# Altium footprint library Connectors.PcbLib: 164 footprints (part 10 of 11)
Each footprint in its own frame and in the unit in brackets; x right, y up, seen from the top. Pads: shape width x height; smd on the part's side, far side on the other; paste and mask are expansions set on the pad; w line width, h text height; cw(c..) or ccw(c..) is an arc to the next point about the centre after c.
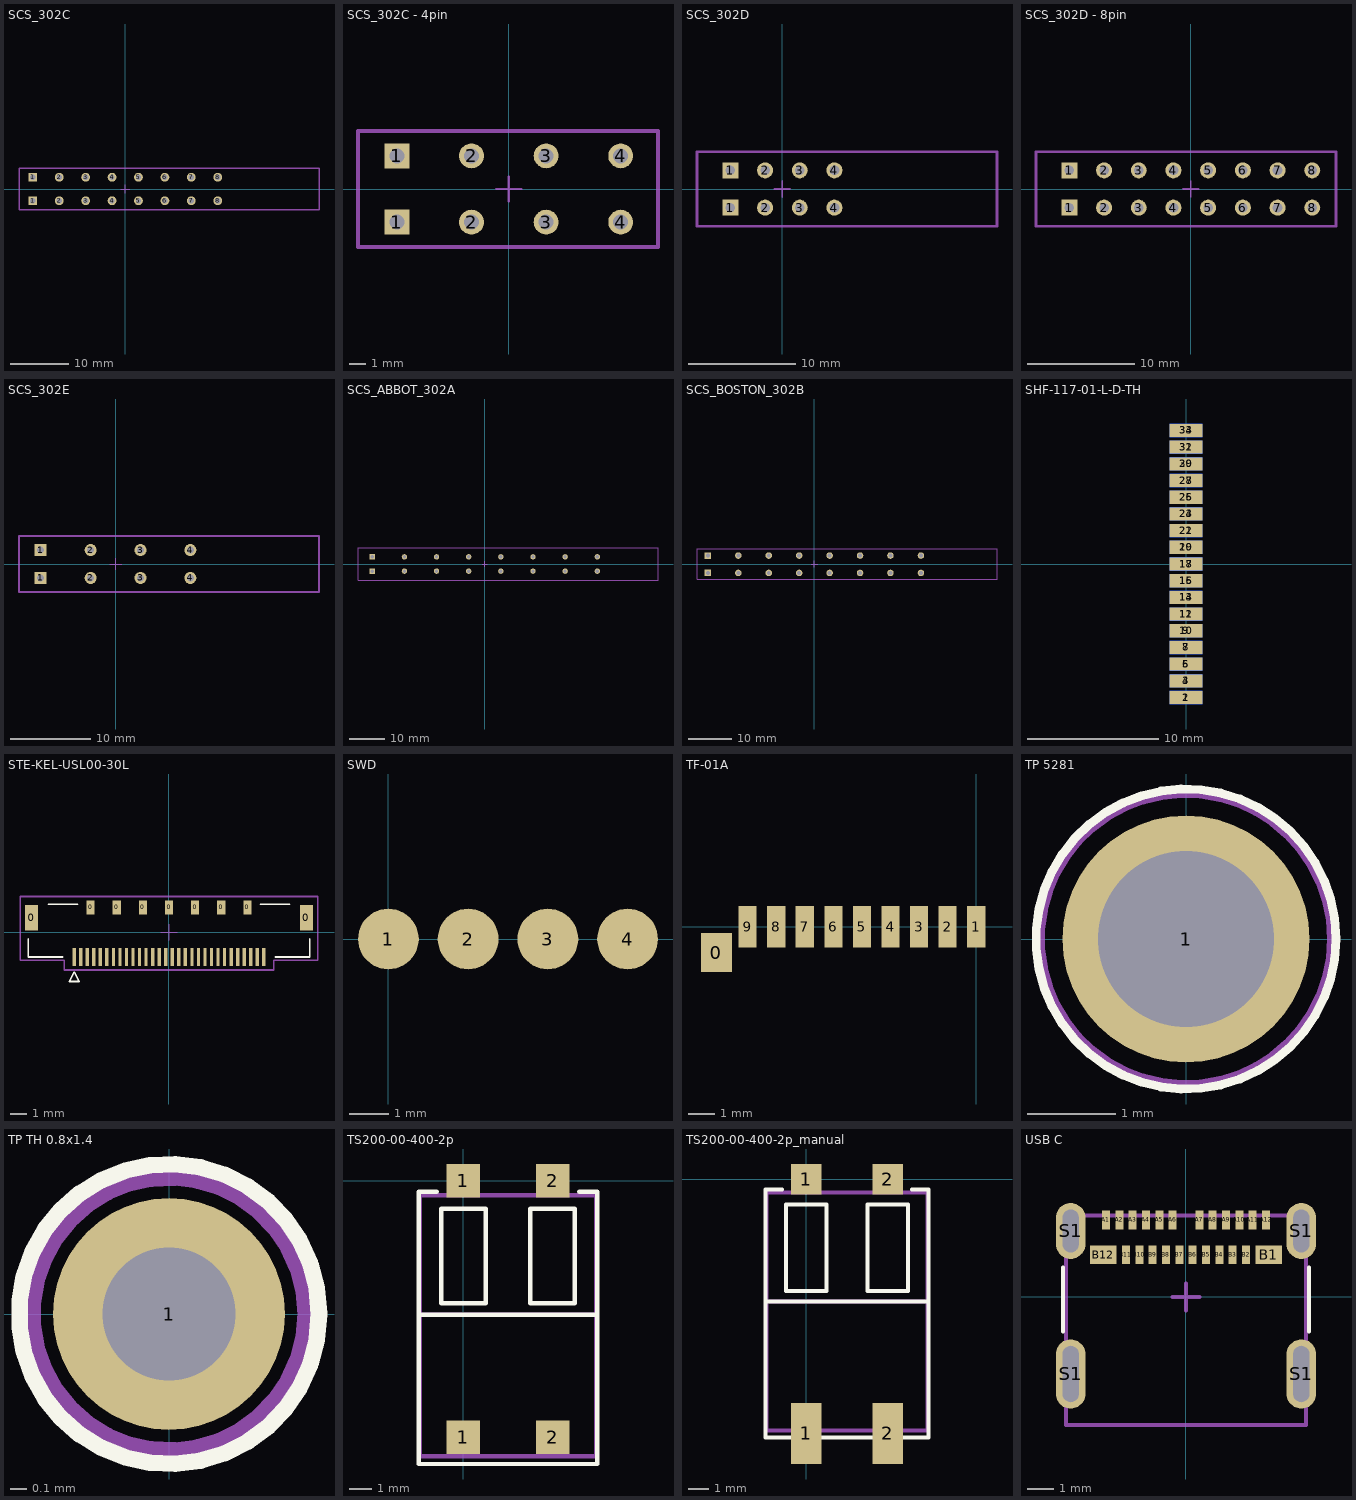
[diagram p9: the footprints below, top view; thin cyan lines are the x and y axes]

## SCS_302C [mm] "Rishena 302C 8 pin connector implanted  electrode"
height 5
pads (16):
  rect 1.5x1.5 hole 0.9: 1(-15.75,-2) 1(-15.75,2)
  round 1.5 hole 0.9: 2(-11.25,-2) 2(-11.25,2) 3(-6.75,-2) 3(-6.75,2) 4(-2.25,-2) 4(-2.25,2) 5(2.25,-2) 5(2.25,2) 6(6.75,-2) 6(6.75,2) 7(11.25,-2) 7(11.25,2) 8(15.75,-2) 8(15.75,2)
Mechanical 15:
  lines w0.15: -0.75,0 0.75,0 ; 0,-0.75 0,0.75
  lines w0.254: -18.1,-3.5 33,-3.5 33,3.5 -18.1,3.5 -18.1,-3.5
3D body "Header.step": height 5.1, standoff 0, extent -15.9,-1.95 -15.6,1.95
3D body "Header.step": height 5.1, standoff 0, extent 15.6,-1.95 15.9,1.95
3D body "Header.step": height 5.1, standoff 0, extent -11.4,-1.95 -11.1,1.95
3D body "Header.step": height 5.1, standoff 0, extent -6.9,-1.95 -6.6,1.95
3D body "Header.step": height 5.1, standoff 0, extent -2.4,-1.95 -2.1,1.95
3D body "Header.step": height 5.1, standoff 0, extent 2.1,-1.95 2.4,1.95
3D body "Header.step": height 5.1, standoff 0, extent 6.6,-1.95 6.9,1.95
3D body "Header.step": height 5.1, standoff 0, extent 11.1,-1.95 11.4,1.95
3D body "302C.step": height 0.65, standoff -0.65, extent -17.3,-3.107 32.224,3.135

## SCS_302C - 4pin [mm] "Rishena 302C 4 pin connector implanted  electrode"
height 5
pads (8):
  rect 1.5x1.5 hole 0.9: 1(-6.75,-2) 1(-6.75,2)
  round 1.5 hole 0.9: 2(-2.25,-2) 2(-2.25,2) 3(2.25,-2) 3(2.25,2) 4(6.75,-2) 4(6.75,2)
Mechanical 15:
  lines w0.15: -0.75,0 0.75,0 ; 0,-0.75 0,0.75
  lines w0.254: -9.1,-3.5 -9.1,3.5 9,3.5 9,-3.5 -9.1,-3.5
3D body "Header.step": height 5.1, standoff 0, extent 6.6,-1.95 6.9,1.95
3D body "Header.step": height 5.1, standoff 0, extent 2.1,-1.95 2.4,1.95
3D body "Header.step": height 5.1, standoff 0, extent -2.4,-1.95 -2.1,1.95
3D body "Header.step": height 5.1, standoff 0, extent -6.9,-1.95 -6.6,1.95
3D body "302C.step": height 3.85, standoff 2.55, extent -9,-3.107 40.524,3.135

## SCS_302D [mm] "Rishena 302D 4pin connector implanted  electrode"
height 5
pads (8):
  rect 1.5x1.5 hole 0.9: 1(-4.875,-1.75) 1(-4.875,1.75)
  round 1.5 hole 0.9: 2(-1.625,-1.75) 2(-1.625,1.75) 3(1.625,-1.75) 3(1.625,1.75) 4(4.875,-1.75) 4(4.875,1.75)
Mechanical 15:
  lines w0.15: -0.75,0 0.75,0 ; 0,-0.75 0,0.75
  lines w0.254: -8,-3.5 -8,3.5 20.1,3.5 20.1,-3.5 -8,-3.5
3D body "302D.step": height 2.8, standoff 1.8, extent -5.5,-1.591 20.821,3.743
3D body "Header.step": height 4.1, standoff -1, extent 4.7,-1.9 5,2
3D body "Header.step": height 4.1, standoff -1, extent -5.025,-1.9 -4.725,2
3D body "Header.step": height 4.1, standoff -1, extent -1.783,-1.9 -1.483,2
3D body "Header.step": height 4.1, standoff -1, extent 1.458,-1.9 1.758,2

## SCS_302D - 8pin [mm] "Rishena 302D 8pin connector implanted  electrode"
height 5
pads (16):
  rect 1.5x1.5 hole 0.9: 1(-11.375,-1.75) 1(-11.375,1.75)
  round 1.5 hole 0.9: 2(-8.125,-1.75) 2(-8.125,1.75) 3(-4.875,-1.75) 3(-4.875,1.75) 4(-1.625,-1.75) 4(-1.625,1.75) 5(1.625,-1.75) 5(1.625,1.75) 6(4.875,-1.75) 6(4.875,1.75) 7(8.125,-1.75) 7(8.125,1.75) 8(11.375,-1.75) 8(11.375,1.75)
Mechanical 15:
  lines w0.15: -0.75,0 0.75,0 ; 0,-0.75 0,0.75
  lines w0.254: -14.5,-3.5 13.6,-3.5 13.6,3.5 -14.5,3.5 -14.5,-3.5
3D body "Header.step": height 4.1, standoff -1, extent 7.958,-1.9 8.258,2
3D body "Header.step": height 4.1, standoff -1, extent 11.2,-1.9 11.5,2
3D body "Header.step": height 4.1, standoff -1, extent 1.458,-1.9 1.758,2
3D body "Header.step": height 4.1, standoff -1, extent 4.7,-1.9 5,2
3D body "Header.step": height 4.1, standoff -1, extent -5.042,-1.9 -4.742,2
3D body "Header.step": height 4.1, standoff -1, extent -8.283,-1.9 -7.983,2
3D body "Header.step": height 4.1, standoff -1, extent -11.525,-1.9 -11.225,2
3D body "Header.step": height 4.1, standoff -1, extent -1.8,-1.9 -1.5,2

## SCS_302E [mm] "Rishena 302E 4pin connector implanted  electrode"
height 5
pads (8):
  rect 1.5x1.5 hole 0.9: 1(-9.387,-1.75) 1(-9.387,1.75)
  round 1.5 hole 0.9: 2(-3.129,-1.75) 2(-3.129,1.75) 3(3.129,-1.75) 3(3.129,1.75) 4(9.387,-1.75) 4(9.387,1.75)
Mechanical 15:
  lines w0.15: -0.75,0 0.75,0 ; 0,-0.75 0,0.75
  lines w0.254: -12.1,-3.5 25.5,-3.5 25.5,3.5 -12.1,3.5 -12.1,-3.5
3D body "302E.step": height 0.5, standoff -0.5, extent -10.1,-1.759 25.221,5.196
3D body "Header.step": height 4.1, standoff -1, extent 3.012,-1.85 3.312,2.05
3D body "Header.step": height 4.1, standoff -1, extent -3.263,-1.85 -2.963,2.05
3D body "Header.step": height 4.1, standoff -1, extent -9.537,-1.85 -9.237,2.05
3D body "Header.step": height 4.1, standoff -1, extent 9.287,-1.85 9.587,2.05

## SCS_ABBOT_302A [mm] "Abbot and Rishena 302A 8 pin connector implanted  electrode"
height 5
pads (16):
  rect 1.5x1.5 hole 0.9: 1(-31.5,-2) 1(-31.5,2)
  round 1.5 hole 0.9: 2(-22.5,-2) 2(-22.5,2) 3(-13.5,-2) 3(-13.5,2) 4(-4.5,-2) 4(-4.5,2) 5(4.5,-2) 5(4.5,2) 6(13.5,-2) 6(13.5,2) 7(22.5,-2) 7(22.5,2) 8(31.5,-2) 8(31.5,2)
Mechanical 15:
  lines w0.15: -0.75,0 0.75,0 ; 0,-0.75 0,0.75
  lines w0.254: -35.5,-4.5 48.5,-4.5 48.5,4.5 -35.5,4.5 -35.5,-4.5
3D body "Header.step": height 4.1, standoff -1, extent -31.65,-1.95 -31.35,1.95
3D body "Header.step": height 4.1, standoff -1, extent 31.35,-1.95 31.65,1.95
3D body "Header.step": height 4.1, standoff -1, extent -22.65,-1.95 -22.35,1.95
3D body "Header.step": height 4.1, standoff -1, extent -13.65,-1.95 -13.35,1.95
3D body "Header.step": height 4.1, standoff -1, extent -4.65,-1.95 -4.35,1.95
3D body "Header.step": height 4.1, standoff -1, extent 4.35,-1.95 4.65,1.95
3D body "Header.step": height 4.1, standoff -1, extent 13.35,-1.95 13.65,1.95
3D body "Header.step": height 4.1, standoff -1, extent 22.35,-1.95 22.65,1.95
3D body "ABBOT-302A.step": height 2.95, standoff 1.65, extent -33,-3.349 48.024,3.125

## SCS_BOSTON_302B [mm] "Boston and Rishena 302B 8 pin connector implanted  electrode"
height 5
pads (16):
  rect 1.5x1.5 hole 0.9: 1(-24.5,-2) 1(-24.5,2)
  round 1.5 hole 0.9: 2(-17.5,-2) 2(-17.5,2) 3(-10.5,-2) 3(-10.5,2) 4(-3.5,-2) 4(-3.5,2) 5(3.5,-2) 5(3.5,2) 6(10.5,-2) 6(10.5,2) 7(17.5,-2) 7(17.5,2) 8(24.5,-2) 8(24.5,2)
Mechanical 15:
  lines w0.15: -0.75,0 0.75,0 ; 0,-0.75 0,0.75
  lines w0.254: -27,-3.4 -27,3.5 42,3.5 42,-3.4 -27,-3.4
3D body "Header.step": height 4.1, standoff -1, extent -24.65,-1.95 -24.35,1.95
3D body "Header.step": height 4.1, standoff -1, extent 24.35,-1.95 24.65,1.95
3D body "Header.step": height 4.1, standoff -1, extent -17.65,-1.95 -17.35,1.95
3D body "Header.step": height 4.1, standoff -1, extent -10.65,-1.95 -10.35,1.95
3D body "Header.step": height 4.1, standoff -1, extent -3.65,-1.95 -3.35,1.95
3D body "Header.step": height 4.1, standoff -1, extent 3.35,-1.95 3.65,1.95
3D body "Header.step": height 4.1, standoff -1, extent 10.35,-1.95 10.65,1.95
3D body "Header.step": height 4.1, standoff -1, extent 17.35,-1.95 17.65,1.95
3D body "BOSTON-302B.step": height 2.95, standoff 1.65, extent -26,-2.597 41.024,2.287

## SHF-117-01-L-D-TH [mm] "CONN HEADER VERT 34POS 1.27MM"
pads (34):
  rect 2.5x1 smd: 1(0,-10.16) 3(0,-8.89) 5(0,-7.62) 7(0,-6.35) 9(0,-5.08) 11(0,-3.81) 13(0,-2.54) 15(0,-1.27) 17(0,0) 19(0,1.27) 21(0,2.54) 23(0,3.81) 25(0,5.08) 27(0,6.35) 29(0,7.62) 31(0,8.89) 33(0,10.16)
  rect 2.5x1 smd far side: 2(0,-10.16) 4(0,-8.89) 6(0,-7.62) 8(0,-6.35) 10(0,-5.08) 12(0,-3.81) 14(0,-2.54) 16(0,-1.27) 18(0,0) 20(0,1.27) 22(0,2.54) 24(0,3.81) 26(0,5.08) 28(0,6.35) 30(0,7.62) 32(0,8.89) 34(0,10.16)
3D body "SHF-117-01-L-D-TH.stp": height 2.1, standoff -3.49, extent -4.699,-13.97 2.54,13.97

## STE-KEL-USL00-30L [mm]
height 1
pads (39):
  rect 0.8x1.55 smd: 0(-8.4,0.885) 0(8.4,0.885)
  rect 0.5x0.88 smd: 0(-4.8,1.515) 0(-3.2,1.515) 0(-1.6,1.515) 0(0,1.515) 0(1.6,1.515) 0(3.2,1.515) 0(4.8,1.515)
  rect 0.2x1.1 smd: 1(-5.8,-1.515) 2(-5.4,-1.515) 3(-5,-1.515) 4(-4.6,-1.515) 5(-4.2,-1.515) 6(-3.8,-1.515) 7(-3.4,-1.515) 8(-3,-1.515) 9(-2.6,-1.515) 10(-2.2,-1.515) 11(-1.8,-1.515) 12(-1.4,-1.515) 13(-1,-1.515) 14(-0.6,-1.515) 15(-0.2,-1.515) 16(0.2,-1.515) 17(0.6,-1.515) 18(1,-1.515) 19(1.4,-1.515) 20(1.8,-1.515) 21(2.2,-1.515) 22(2.6,-1.515) 23(3,-1.515) 24(3.4,-1.515) 25(3.8,-1.515) 26(4.2,-1.515) 27(4.6,-1.515) 28(5,-1.515) 29(5.4,-1.515) 30(5.8,-1.515)
Top Overlay:
  lines w0.1: -8.6,-0.415 -8.6,-1.515 -6.5,-1.515 ; -7.375,1.71 -5.6,1.71 ; 5.6,1.71 7.375,1.71 ; 6.5,-1.515 8.6,-1.515 8.6,-0.415 ; -6.1,-3.015 -5.8,-2.44 -5.5,-3.015 -6.1,-3.015
Mechanical 13:
  lines w0.05: -0.5,0 0,0 ; 0,-0.5 0,0 ; 0,0.5 0,0 ; 0.5,0 0,0
  lines w0.1: -9.1,-1.715 -9.1,2.185 9.1,2.185 9.1,-1.715 6.4,-1.715 6.4,-2.315 -6.4,-2.315 -6.4,-1.715 -9.1,-1.715
3D body "User Library-usl00-30l_p0-4_l16-6_w2-75-1.step": height 0.97, standoff -0.03, extent -8.3,-1.515 8.3,1.585

## SWD [mil]
pads (4):
  round 60 smd paste-60 mask+2.01: 1(0,0) 2(78.74,0) 3(157.48,0) 4(236.22,0)

## TF-01A [mm] "SD Card Connector"
height 2.45
pads (10):
  rect 1.2x1.5 smd: 0(-10,-1)
  rect 0.7x1.6 smd: 1(0,0) 2(-1.1,0) 3(-2.2,0) 4(-3.3,0) 5(-4.4,0) 6(-5.5,0) 7(-6.6,0) 8(-7.7,0) 9(-8.8,0)

## TP 5281 [mm]
pads (1):
  round 2.8 hole 2 unplated mask+0.07: 1(0,0)
Top Overlay:
  circle w0.1: c0,0 r1.7
Mechanical 15:
  circle w0.1: c0,0 r1.649
  lines w0.15: -0.5,0 0.5,0 ; 0,-0.5 0,0.5
3D body "5281.step": height 8.12, standoff -3.17, extent -1.576,-1.587 1.576,1.587

## TP TH 0.8x1.4 [mm]
pads (1):
  round 1.4 hole 0.8 mask+0.07: 1(0,0)
Top Overlay:
  circle w0.1: c0,0 r0.906
Mechanical 15:
  circle w0.1: c0,0 r0.825
  lines w0.15: -0.5,0 0.5,0 ; 0,-0.5 0,0.5

## TS200-00-400-2p [mm] "SMD PCB terminal block"
height 4.5
pads (4):
  rect 1.5x1.5 smd: 1(0,-11.5) 1(0,0) 2(4,-11.5) 2(4,0)
Top Overlay:
  lines w0.2: -2,-6 6,-6 ; -1.2,-0.5 -2,-0.5 -2,-12.7 6,-12.7 6,-0.5 5.2,-0.5 ; -1,-5.5 1,-5.5 1,-1.25 -1,-1.25 -1,-5.5 ; 3,-5.5 5,-5.5 5,-1.25 3,-1.25 3,-5.5
Mechanical 13:
  lines w0.2: -1.95,-6 5.95,-6 ; -1.95,-12.35 -1.95,-0.65 5.95,-0.65 5.95,-12.35 -1.95,-12.35
3D body "2060-452_998-404.stp": height 5.5, standoff 0, extent -1.95,-12.35 5.95,0.75

## TS200-00-400-2p_manual [mm] "SMD PCB terminal block"
height 4.5
pads (4):
  rect 1.5x3 smd: 1(0,-12.5) 2(4,-12.5)
  rect 1.5x1.5 smd: 1(0,0) 2(4,0)
Top Overlay:
  lines w0.2: -2,-6 6,-6 ; -1.2,-0.5 -2,-0.5 -2,-12.7 6,-12.7 6,-0.5 5.2,-0.5 ; -1,-5.5 -1,-1.25 1,-1.25 1,-5.5 -1,-5.5 ; 3,-5.5 3,-1.25 5,-1.25 5,-5.5 3,-5.5
Mechanical 13:
  lines w0.2: -1.95,-6 5.95,-6 ; -1.95,-12.35 5.95,-12.35 5.95,-0.65 -1.95,-0.65 -1.95,-12.35
3D body "2060-452_998-404.stp": height 5.45, standoff -0.05, extent -1.95,-12.6 5.95,0.5

## USB C [mm] "1054500101"
pads (28):
  rect 0.3x0.7 smd mask+0.08: A1(-3,2.885) A2(-2.5,2.885) A3(-2,2.885) A4(-1.5,2.885) A5(-1,2.885) A6(-0.5,2.885) A7(0.5,2.885) A8(1,2.885) A9(1.5,2.885) A10(2,2.885) A11(2.5,2.885) A12(3,2.885) B2(2.25,1.585) B3(1.75,1.585) B4(1.25,1.585) B5(0.75,1.585) B6(0.25,1.585) B7(-0.25,1.585) B8(-0.75,1.585) B9(-1.25,1.585) B10(-1.75,1.585) B11(-2.25,1.585)
  rect 1x0.7 smd mask+0.08: B1(3.1,1.585) B12(-3.1,1.585)
  oval 1.1x2.6 hole 0.6 slot 2.1 at 90 deg mask+0.08: S1(-4.32,-2.885) S1(4.32,-2.885)
  oval 1.1x2.1 hole 0.6 slot 1.6 at 90 deg mask+0.08: S1(-4.32,2.475) S1(4.32,2.475)
Top Overlay:
  lines w0.15: -4.6,-1.3 -4.6,1.1 ; 4.6,-1.3 4.6,1.1
Mechanical 15:
  lines w0.15: -0.5,0 0.5,0 ; 0,-0.5 0,0.5 ; -4.5,-4.8 4.5,-4.8 4.5,3.06 -4.5,3.06 -4.5,-4.8
3D body "1054500101.stp": height 3.18, standoff -0.78, extent -4.47,-4.7 4.47,3.2